# Altium footprint library 6-Connectors-4.PcbLib: 166 footprints (part 1 of 12) (continued)
## 3M_N2534-5002RB [mm] "34 Contacts - Right Angle .100\" x .100\" Low Profile Four-Wall Header"
height 8.59
pads (34):
  round 1.6 hole 1: 1(-20.32,-1.27) 2(-20.32,1.27) 3(-17.78,-1.27) 4(-17.78,1.27) 5(-15.24,-1.27) 6(-15.24,1.27) 7(-12.7,-1.27) 8(-12.7,1.27) 9(-10.16,-1.27) 10(-10.16,1.27) 11(-7.62,-1.27) 12(-7.62,1.27) 13(-5.08,-1.27) 14(-5.08,1.27) 15(-2.54,-1.27) 16(-2.54,1.27) 17(0,-1.27) 18(0,1.27) 19(2.54,-1.27) 20(2.54,1.27) 21(5.08,-1.27) 22(5.08,1.27) 23(7.62,-1.27) 24(7.62,1.27) 25(10.16,-1.27) 26(10.16,1.27) 27(12.7,-1.27) 28(12.7,1.27) 29(15.24,-1.27) 30(15.24,1.27) 31(17.78,-1.27) 32(17.78,1.27) 33(20.32,-1.27) 34(20.32,1.27)
Top Overlay:
  circle w0.3: c-22.09,-1.27 r0.15
  lines w0.2: -21.333,11.28 -20.317,8.74 -19.301,11.28 ; -18.539,2.466 -18.539,11.28 ; -18.539,4.015 -17.269,4.015 -17.269,6.301 cw(c-16.507,6.301) -15.745,6.301 -15.745,4.015 -14.475,4.015 ; -17.548,11.28 -17.548,10.06 -15.465,10.06 -15.465,11.28 ; -17.269,4.853 -15.745,4.853 ; -14.475,2.466 -14.475,11.28 ; -3.362,11.28 cw(c-3.362,10.01) -2.092,10.01 -2.092,4.345 ccw(c-1.457,4.345) -1.457,3.71 ; -2.092,4.853 2.099,4.853 ; -1.457,3.71 1.464,3.71 ; -0.311,4.853 0.318,4.853 0.318,10.619 ; -0.305,4.853 -0.305,10.628 ; 1.464,3.71 ccw(c1.464,4.345) 2.099,4.345 2.099,10.01 ; 2.099,10.01 cw(c3.369,10.01) 3.369,11.28 ; 17.021,2.466 17.021,11.28 ; 17.021,4.015 18.291,4.015 18.291,6.301 cw(c19.053,6.301) 19.815,6.301 19.815,4.015 21.085,4.015 ; 18.012,11.28 18.012,10.06 20.095,10.06 20.095,11.28 ; 18.291,4.853 19.815,4.853 ; 21.085,2.466 21.085,11.28 ; -0.305,10.628 -0.05,10.954 0.063,10.954 0.318,10.619 ; -0.305,10.628 0.318,10.619 ; -25.244,1.882 -25.244,11.28 25.251,11.28 25.251,1.882 23.498,1.882 cw(c23.244,1.882) 22.99,1.882 22.99,2.466 -22.984,2.466 -22.984,1.882 cw(c-23.238,1.882) -23.492,1.882 -25.244,1.882
  text "34" at 21.805,0.206 h1.02
Mechanical 14:
  circle w0.3: c-22.09,-1.27 r0.15
  lines w0.1: -21.333,11.28 -20.317,8.74 -19.301,11.28 ; -18.539,2.466 -18.539,11.28 ; -18.539,4.015 -17.269,4.015 -17.269,6.301 cw(c-16.507,6.301) -15.745,6.301 -15.745,4.015 -14.475,4.015 ; -17.548,11.28 -17.548,10.06 -15.465,10.06 -15.465,11.28 ; -17.269,4.853 -15.745,4.853 ; -14.475,2.466 -14.475,11.28 ; -3.362,11.28 cw(c-3.362,10.01) -2.092,10.01 -2.092,4.345 ccw(c-1.457,4.345) -1.457,3.71 ; -2.092,4.853 2.099,4.853 ; -1.457,3.71 1.464,3.71 ; -0.311,4.853 0.318,4.853 0.318,10.619 ; -0.305,4.853 -0.305,10.628 ; 1.464,3.71 ccw(c1.464,4.345) 2.099,4.345 2.099,10.01 ; 2.099,10.01 cw(c3.369,10.01) 3.369,11.28 ; 17.021,2.466 17.021,11.28 ; 17.021,4.015 18.291,4.015 18.291,6.301 cw(c19.053,6.301) 19.815,6.301 19.815,4.015 21.085,4.015 ; 18.012,11.28 18.012,10.06 20.095,10.06 20.095,11.28 ; 18.291,4.853 19.815,4.853 ; 21.085,2.466 21.085,11.28 ; -0.305,10.628 -0.05,10.954 0.063,10.954 0.318,10.619 ; -0.305,10.628 0.318,10.619 ; -25.244,1.882 -25.244,11.28 25.251,11.28 25.251,1.882 23.498,1.882 cw(c23.244,1.882) 22.99,1.882 22.99,2.466 -22.984,2.466 -22.984,1.882 cw(c-23.238,1.882) -23.492,1.882 -25.244,1.882
  text "34" at 21.805,0.206 h1.02
Mechanical 15:
  lines w0.05: -0.5,0 0.5,0 ; 0,-0.5 0,0.5
3D body "v160-080.stp": height 0.02, standoff -1.65, extent 19.52,0.47 21.12,2.07
3D body "v160-080.stp": height 0.02, standoff -1.65, extent 19.52,-2.07 21.12,-0.47
3D body "v160-080.stp": height 0.02, standoff -1.65, extent 16.98,0.47 18.58,2.07
3D body "v160-080.stp": height 0.02, standoff -1.65, extent 16.98,-2.07 18.58,-0.47
3D body "v160-080.stp": height 0.02, standoff -1.65, extent 14.44,0.47 16.04,2.07
3D body "v160-080.stp": height 0.02, standoff -1.65, extent 14.44,-2.07 16.04,-0.47
3D body "v160-080.stp": height 0.02, standoff -1.65, extent 11.9,0.47 13.5,2.07
3D body "v160-080.stp": height 0.02, standoff -1.65, extent 11.9,-2.07 13.5,-0.47
3D body "v160-080.stp": height 0.02, standoff -1.65, extent 9.36,0.47 10.96,2.07
3D body "v160-080.stp": height 0.02, standoff -1.65, extent 9.36,-2.07 10.96,-0.47
3D body "v160-080.stp": height 0.02, standoff -1.65, extent 6.82,0.47 8.42,2.07
3D body "v160-080.stp": height 0.02, standoff -1.65, extent 6.82,-2.07 8.42,-0.47
3D body "v160-080.stp": height 0.02, standoff -1.65, extent 4.28,0.47 5.88,2.07
3D body "v160-080.stp": height 0.02, standoff -1.65, extent 4.28,-2.07 5.88,-0.47
3D body "v160-080.stp": height 0.02, standoff -1.65, extent 1.74,0.47 3.34,2.07
3D body "v160-080.stp": height 0.02, standoff -1.65, extent 1.74,-2.07 3.34,-0.47
3D body "v160-080.stp": height 0.02, standoff -1.65, extent -0.8,0.47 0.8,2.07
3D body "v160-080.stp": height 0.02, standoff -1.65, extent -0.8,-2.07 0.8,-0.47
3D body "v160-080.stp": height 0.02, standoff -1.65, extent -3.34,0.47 -1.74,2.07
3D body "v160-080.stp": height 0.02, standoff -1.65, extent -3.34,-2.07 -1.74,-0.47
3D body "v160-080.stp": height 0.02, standoff -1.65, extent -5.88,0.47 -4.28,2.07
3D body "v160-080.stp": height 0.02, standoff -1.65, extent -5.88,-2.07 -4.28,-0.47
3D body "v160-080.stp": height 0.02, standoff -1.65, extent -8.42,0.47 -6.82,2.07
3D body "v160-080.stp": height 0.02, standoff -1.65, extent -8.42,-2.07 -6.82,-0.47
3D body "v160-080.stp": height 0.02, standoff -1.65, extent -10.96,0.47 -9.36,2.07
3D body "v160-080.stp": height 0.02, standoff -1.65, extent -10.96,-2.07 -9.36,-0.47
3D body "v160-080.stp": height 0.02, standoff -1.65, extent -13.5,0.47 -11.9,2.07
3D body "v160-080.stp": height 0.02, standoff -1.65, extent -13.5,-2.07 -11.9,-0.47
3D body "v160-080.stp": height 0.02, standoff -1.65, extent -16.04,-2.07 -14.44,-0.47
3D body "v160-080.stp": height 0.02, standoff -1.65, extent -16.04,0.47 -14.44,2.07
3D body "v160-080.stp": height 0.02, standoff -1.65, extent -18.58,-2.07 -16.98,-0.47
3D body "v160-080.stp": height 0.02, standoff -1.65, extent -18.58,0.47 -16.98,2.07
3D body "v160-080.stp": height 0.02, standoff -1.65, extent -21.12,0.47 -19.52,2.07
3D body "v160-080.stp": height 0.02, standoff -1.65, extent -21.12,-2.07 -19.52,-0.47
3D body "3M_N2534-5002RB.stp": height 8.64, standoff -3.98, extent -25.241,-1.587 25.254,11.267

## 3M_N2540-6V0C-RB-WG [mm] "40 Contacts - Straight SMD .100\" x .100\" Low Profile Four-Wall Header"
height 10.16
pads (40):
  rect 1.27x5.08 smd: 1(-24.13,-3.43) 2(-24.13,3.43) 3(-21.59,-3.43) 4(-21.59,3.43) 5(-19.05,-3.43) 6(-19.05,3.43) 7(-16.51,-3.43) 8(-16.51,3.43) 9(-13.97,-3.43) 10(-13.97,3.43) 11(-11.43,-3.43) 12(-11.43,3.43) 13(-8.89,-3.43) 14(-8.89,3.43) 15(-6.35,-3.43) 16(-6.35,3.43) 17(-3.81,-3.43) 18(-3.81,3.43) 19(-1.27,-3.43) 20(-1.27,3.43) 21(1.27,-3.43) 22(1.27,3.43) 23(3.81,-3.43) 24(3.81,3.43) 25(6.35,-3.43) 26(6.35,3.43) 27(8.89,-3.43) 28(8.89,3.43) 29(11.43,-3.43) 30(11.43,3.43) 31(13.97,-3.43) 32(13.97,3.43) 33(16.51,-3.43) 34(16.51,3.43) 35(19.05,-3.43) 36(19.05,3.43) 37(21.59,-3.43) 38(21.59,3.43) 39(24.13,-3.43) 40(24.13,3.43)
Top Overlay:
  circle w0.3: c-26.88,-4.949 r0.15
  lines w0.2: -28.042,-1.599 -25.629,-1.599 -25.629,1.599 -28.042,1.599 ; -27.94,-1.629 -27.94,1.629 ; -27.744,-4.064 -26.88,-3.2 -26.016,-4.064 ; -25.165,-4.064 -29.058,-4.064 -29.058,4.064 -28.397,4.064 cw(c-27.94,4.064) -27.483,4.064 -25.165,4.064 ; -25.165,-3.175 -28.042,-3.175 -28.042,-1.475 -28.448,-1.475 -28.448,1.475 -28.042,1.475 -28.042,3.175 -25.165,3.175 ; 25.165,-4.064 29.058,-4.064 29.058,4.064 28.397,4.064 ccw(c27.94,4.064) 27.483,4.064 25.165,4.064 ; 25.165,-3.175 28.042,-3.175 28.042,-1.524 28.448,-1.524 28.448,1.524 28.042,1.524 28.042,3.175 25.165,3.175 ; 27.94,-1.645 28.042,-1.631 ; 27.94,1.645 28.042,1.631 ; 25.629,-1.664 25.629,1.664 27.94,1.664 27.94,-1.664 25.629,-1.664
  text "40" at 25.453,4.767 h1.02
Mechanical 8:
  drawing of 324 lines, arcs and shapes, not listed
Mechanical 14:
  lines w0.1: -28.042,-1.599 -25.629,-1.599 -25.629,1.599 -28.042,1.599 ; -27.94,-1.629 -27.94,1.629 ; -27.744,-4.064 -26.88,-3.2 -26.016,-4.064 ; -3.365,-4.064 -3.365,-3.175 ; -2.095,-4.064 -2.095,-2.159 2.096,-2.159 2.096,-4.064 ; -2.095,-3.175 -28.042,-3.175 -28.042,-1.475 -28.448,-1.475 -28.448,1.475 -28.042,1.475 -28.042,3.175 18.979,3.175 18.987,3.175 ; -1.46,-4.064 -1.46,-2.159 ; 1.461,-4.064 1.461,-2.159 ; 2.096,-3.175 28.042,-3.175 28.042,-1.524 28.448,-1.524 28.448,1.524 28.042,1.524 28.042,3.175 23.178,3.175 ; 3.366,-4.064 3.366,-3.175 ; 18.987,4.064 18.987,2.159 23.178,2.159 23.178,4.064 ; 19.622,2.159 19.622,4.064 ; 24.448,3.175 24.448,4.064 ; 27.94,-1.645 28.042,-1.631 ; 27.94,1.645 28.042,1.631 ; -29.058,-4.064 -22.352,-4.064 -22.352,-3.81 -18.288,-3.81 -18.288,-4.064 20.828,-4.064 20.828,-3.81 24.892,-3.81 24.892,-4.064 29.058,-4.064 29.058,4.064 28.397,4.064 ccw(c27.94,4.064) 27.483,4.064 14.427,4.064 ccw(c13.97,4.064) 13.513,4.064 0.457,4.064 ccw(c0,4.064) -0.457,4.064 -13.513,4.064 ccw(c-13.97,4.064) -14.427,4.064 -27.483,4.064 ccw(c-27.94,4.064) -28.397,4.064 -29.058,4.064 -29.058,-4.064 ; 25.629,-1.664 25.629,1.664 27.94,1.664 27.94,-1.664 25.629,-1.664
  text "40" at 25.453,4.767 h1.02
Mechanical 15:
  lines w0.05: -29.308,-6.22 -29.308,6.22 29.308,6.22 29.308,-6.22 -29.308,-6.22
3D body "p508-127.stp": height 0.02, standoff 0, extent 23.495,0.889 24.765,5.969
3D body "p508-127.stp": height 0.02, standoff 0, extent 23.495,-5.971 24.765,-0.891
3D body "p508-127.stp": height 0.02, standoff 0, extent 20.955,0.889 22.225,5.969
3D body "p508-127.stp": height 0.02, standoff 0, extent 20.955,-5.971 22.225,-0.891
3D body "p508-127.stp": height 0.02, standoff 0, extent 18.415,0.889 19.685,5.969
3D body "p508-127.stp": height 0.02, standoff 0, extent 18.415,-5.971 19.685,-0.891
3D body "p508-127.stp": height 0.02, standoff 0, extent 15.875,0.889 17.145,5.969
3D body "p508-127.stp": height 0.02, standoff 0, extent 15.875,-5.971 17.145,-0.891
3D body "p508-127.stp": height 0.02, standoff 0, extent 13.335,0.889 14.605,5.969
3D body "p508-127.stp": height 0.02, standoff 0, extent 13.335,-5.971 14.605,-0.891
3D body "p508-127.stp": height 0.02, standoff 0, extent 10.795,0.889 12.065,5.969
3D body "p508-127.stp": height 0.02, standoff 0, extent 10.795,-5.971 12.065,-0.891
3D body "p508-127.stp": height 0.02, standoff 0, extent 8.255,0.889 9.525,5.969
3D body "p508-127.stp": height 0.02, standoff 0, extent 8.255,-5.971 9.525,-0.891
3D body "p508-127.stp": height 0.02, standoff 0, extent 5.715,0.889 6.985,5.969
3D body "p508-127.stp": height 0.02, standoff 0, extent 5.715,-5.971 6.985,-0.891
3D body "p508-127.stp": height 0.02, standoff 0, extent 3.175,0.889 4.445,5.969
3D body "p508-127.stp": height 0.02, standoff 0, extent 3.175,-5.971 4.445,-0.891
3D body "p508-127.stp": height 0.02, standoff 0, extent 0.635,0.889 1.905,5.969
3D body "p508-127.stp": height 0.02, standoff 0, extent 0.635,-5.971 1.905,-0.891
3D body "p508-127.stp": height 0.02, standoff 0, extent -1.905,0.889 -0.635,5.969
3D body "p508-127.stp": height 0.02, standoff 0, extent -1.905,-5.971 -0.635,-0.891
3D body "p508-127.stp": height 0.02, standoff 0, extent -4.445,0.889 -3.175,5.969
3D body "p508-127.stp": height 0.02, standoff 0, extent -4.445,-5.971 -3.175,-0.891
3D body "p508-127.stp": height 0.02, standoff 0, extent -6.985,0.889 -5.715,5.969
3D body "p508-127.stp": height 0.02, standoff 0, extent -6.985,-5.971 -5.715,-0.891
3D body "p508-127.stp": height 0.02, standoff 0, extent -9.525,0.889 -8.255,5.969
3D body "p508-127.stp": height 0.02, standoff 0, extent -9.525,-5.971 -8.255,-0.891
3D body "p508-127.stp": height 0.02, standoff 0, extent -12.065,0.889 -10.795,5.969
3D body "p508-127.stp": height 0.02, standoff 0, extent -12.065,-5.971 -10.795,-0.891
3D body "p508-127.stp": height 0.02, standoff 0, extent -14.605,0.889 -13.335,5.969
3D body "p508-127.stp": height 0.02, standoff 0, extent -14.605,-5.971 -13.335,-0.891
3D body "p508-127.stp": height 0.02, standoff 0, extent -17.145,0.889 -15.875,5.969
3D body "p508-127.stp": height 0.02, standoff 0, extent -17.145,-5.971 -15.875,-0.891
3D body "p508-127.stp": height 0.02, standoff 0, extent -19.685,-5.971 -18.415,-0.891
3D body "p508-127.stp": height 0.02, standoff 0, extent -22.225,-5.971 -20.955,-0.891
3D body "p508-127.stp": height 0.02, standoff 0, extent -24.765,-5.971 -23.495,-0.891
3D body "p508-127.stp": height 0.02, standoff 0, extent -19.685,0.889 -18.415,5.969
3D body "p508-127.stp": height 0.02, standoff 0, extent -22.225,0.889 -20.955,5.969
3D body "p508-127.stp": height 0.02, standoff 0, extent -24.765,0.889 -23.495,5.969
3D body "3M_N2540-6V0C-RB-WG.stp": height 10.16, standoff 0, extent -29.057,-5.588 29.058,5.588

## 3M_N2550-5002RB [mm] "50 Contacts - Right Angle .100\" x .100\" Low Profile Four-Wall Header"
height 8.59
pads (50):
  round 1.6 hole 0.9: 1(-30.48,-1.27) 2(-30.48,1.27) 3(-27.94,-1.27) 4(-27.94,1.27) 5(-25.4,-1.27) 6(-25.4,1.27) 7(-22.86,-1.27) 8(-22.86,1.27) 9(-20.32,-1.27) 10(-20.32,1.27) 11(-17.78,-1.27) 12(-17.78,1.27) 13(-15.24,-1.27) 14(-15.24,1.27) 15(-12.7,-1.27) 16(-12.7,1.27) 17(-10.16,-1.27) 18(-10.16,1.27) 19(-7.62,-1.27) 20(-7.62,1.27) 21(-5.08,-1.27) 22(-5.08,1.27) 23(-2.54,-1.27) 24(-2.54,1.27) 25(0,-1.27) 26(0,1.27) 27(2.54,-1.27) 28(2.54,1.27) 29(5.08,-1.27) 30(5.08,1.27) 31(7.62,-1.27) 32(7.62,1.27) 33(10.16,-1.27) 34(10.16,1.27) 35(12.7,-1.27) 36(12.7,1.27) 37(15.24,-1.27) 38(15.24,1.27) 39(17.78,-1.27) 40(17.78,1.27) 41(20.32,-1.27) 42(20.32,1.27) 43(22.86,-1.27) 44(22.86,1.27) 45(25.4,-1.27) 46(25.4,1.27) 47(27.94,-1.27) 48(27.94,1.27) 49(30.48,-1.27) 50(30.48,1.27)
Top Overlay:
  circle w0.3: c-32.25,-1.27 r0.15
  lines w0.2: -28.702,2.459 -28.702,11.273 ; -28.702,4.009 -27.432,4.009 -27.432,6.295 ; -27.711,11.273 -27.711,10.054 -25.629,10.054 -25.629,11.273 ; -27.432,4.85 -25.908,4.847 ; -27.432,6.297 cw(c-26.67,6.297) -25.908,6.297 ; -25.908,6.295 -25.908,4.009 -24.638,4.007 ; -24.638,2.459 -24.638,11.273 ; -3.366,11.273 cw(c-3.366,10.003) -2.096,10.003 -2.095,4.339 ccw(c-1.46,4.339) -1.46,3.704 1.46,3.704 ccw(c1.46,4.339) 2.095,4.339 2.095,10.003 cw(c3.366,10.003) 3.366,11.273 ; -2.095,4.847 2.095,4.847 ; -0.314,4.853 -0.314,10.719 ; 0.314,4.847 0.314,10.719 ; 27.178,2.459 27.178,11.273 ; 27.178,4.009 28.448,4.009 28.448,6.295 cw(c29.21,6.295) 29.972,6.295 29.972,4.009 31.242,4.009 ; 28.448,4.847 29.972,4.847 ; 31.242,2.459 31.242,11.273 ; -0.314,10.719 -0.06,10.973 0.06,10.973 0.314,10.719 ; -0.314,10.719 0.314,10.719 ; -35.408,1.875 -33.655,1.875 ccw(c-33.401,1.875) -33.147,1.875 -33.147,2.459 33.147,2.459 33.147,1.875 ccw(c33.401,1.875) 33.655,1.875 35.408,1.875 35.408,11.273 -35.408,11.273 -35.408,1.875
  text "50" at 31.965,0.206 h1.02
Mechanical 8:
  drawing of 204 lines, arcs and shapes, not listed
Mechanical 14:
  circle w0.3: c-32.25,-1.27 r0.15
  lines w0.1: -28.702,2.459 -28.702,11.273 ; -28.702,4.009 -27.432,4.009 -27.432,6.295 ; -27.711,11.273 -27.711,10.054 -25.629,10.054 -25.629,11.273 ; -27.432,4.85 -25.908,4.847 ; -27.432,6.297 cw(c-26.67,6.297) -25.908,6.297 ; -25.908,6.295 -25.908,4.009 -24.638,4.007 ; -24.638,2.459 -24.638,11.273 ; -3.366,11.273 cw(c-3.366,10.003) -2.096,10.003 -2.095,4.339 ccw(c-1.46,4.339) -1.46,3.704 1.46,3.704 ccw(c1.46,4.339) 2.095,4.339 2.095,10.003 cw(c3.366,10.003) 3.366,11.273 ; -2.095,4.847 2.095,4.847 ; -0.314,4.853 -0.314,10.719 ; 0.314,4.847 0.314,10.719 ; 27.178,2.459 27.178,11.273 ; 27.178,4.009 28.448,4.009 28.448,6.295 cw(c29.21,6.295) 29.972,6.295 29.972,4.009 31.242,4.009 ; 28.448,4.847 29.972,4.847 ; 31.242,2.459 31.242,11.273 ; -0.314,10.719 -0.06,10.973 0.06,10.973 0.314,10.719 ; -0.314,10.719 0.314,10.719 ; -35.408,1.875 -33.655,1.875 ccw(c-33.401,1.875) -33.147,1.875 -33.147,2.459 33.147,2.459 33.147,1.875 ccw(c33.401,1.875) 33.655,1.875 35.408,1.875 35.408,11.273 -35.408,11.273 -35.408,1.875
  text "50" at 31.965,0.206 h1.02
3D body "v160-080.stp": height 0.02, standoff -1.65, extent 29.68,0.47 31.28,2.07
3D body "v160-080.stp": height 0.02, standoff -1.65, extent 29.68,-2.07 31.28,-0.47
3D body "v160-080.stp": height 0.02, standoff -1.65, extent 27.14,0.47 28.74,2.07
3D body "v160-080.stp": height 0.02, standoff -1.65, extent 27.14,-2.07 28.74,-0.47
3D body "v160-080.stp": height 0.02, standoff -1.65, extent 24.6,0.47 26.2,2.07
3D body "v160-080.stp": height 0.02, standoff -1.65, extent 24.6,-2.07 26.2,-0.47
3D body "v160-080.stp": height 0.02, standoff -1.65, extent 22.06,0.47 23.66,2.07
3D body "v160-080.stp": height 0.02, standoff -1.65, extent 22.06,-2.07 23.66,-0.47
3D body "v160-080.stp": height 0.02, standoff -1.65, extent 19.52,0.47 21.12,2.07
3D body "v160-080.stp": height 0.02, standoff -1.65, extent 19.52,-2.07 21.12,-0.47
3D body "v160-080.stp": height 0.02, standoff -1.65, extent 16.98,0.47 18.58,2.07
3D body "v160-080.stp": height 0.02, standoff -1.65, extent 16.98,-2.07 18.58,-0.47
3D body "v160-080.stp": height 0.02, standoff -1.65, extent 14.44,0.47 16.04,2.07
3D body "v160-080.stp": height 0.02, standoff -1.65, extent 14.44,-2.07 16.04,-0.47
3D body "v160-080.stp": height 0.02, standoff -1.65, extent 11.9,0.47 13.5,2.07
3D body "v160-080.stp": height 0.02, standoff -1.65, extent 11.9,-2.07 13.5,-0.47
3D body "v160-080.stp": height 0.02, standoff -1.65, extent 9.36,0.47 10.96,2.07
3D body "v160-080.stp": height 0.02, standoff -1.65, extent 9.36,-2.07 10.96,-0.47
3D body "v160-080.stp": height 0.02, standoff -1.65, extent 6.82,0.47 8.42,2.07
3D body "v160-080.stp": height 0.02, standoff -1.65, extent 6.82,-2.07 8.42,-0.47
3D body "v160-080.stp": height 0.02, standoff -1.65, extent 4.28,0.47 5.88,2.07
3D body "v160-080.stp": height 0.02, standoff -1.65, extent 4.28,-2.07 5.88,-0.47
3D body "v160-080.stp": height 0.02, standoff -1.65, extent 1.74,0.47 3.34,2.07
3D body "v160-080.stp": height 0.02, standoff -1.65, extent 1.74,-2.07 3.34,-0.47
3D body "v160-080.stp": height 0.02, standoff -1.65, extent -0.8,0.47 0.8,2.07
3D body "v160-080.stp": height 0.02, standoff -1.65, extent -0.8,-2.07 0.8,-0.47
3D body "v160-080.stp": height 0.02, standoff -1.65, extent -3.34,0.47 -1.74,2.07
3D body "v160-080.stp": height 0.02, standoff -1.65, extent -3.34,-2.07 -1.74,-0.47
3D body "v160-080.stp": height 0.02, standoff -1.65, extent -5.88,0.47 -4.28,2.07
3D body "v160-080.stp": height 0.02, standoff -1.65, extent -5.88,-2.07 -4.28,-0.47
3D body "v160-080.stp": height 0.02, standoff -1.65, extent -8.42,0.47 -6.82,2.07
3D body "v160-080.stp": height 0.02, standoff -1.65, extent -8.42,-2.07 -6.82,-0.47
3D body "v160-080.stp": height 0.02, standoff -1.65, extent -10.96,0.47 -9.36,2.07
3D body "v160-080.stp": height 0.02, standoff -1.65, extent -10.96,-2.07 -9.36,-0.47
3D body "v160-080.stp": height 0.02, standoff -1.65, extent -13.5,0.47 -11.9,2.07
3D body "v160-080.stp": height 0.02, standoff -1.65, extent -13.5,-2.07 -11.9,-0.47
3D body "v160-080.stp": height 0.02, standoff -1.65, extent -16.04,0.47 -14.44,2.07
3D body "v160-080.stp": height 0.02, standoff -1.65, extent -16.04,-2.07 -14.44,-0.47
3D body "v160-080.stp": height 0.02, standoff -1.65, extent -18.58,0.47 -16.98,2.07
3D body "v160-080.stp": height 0.02, standoff -1.65, extent -18.58,-2.07 -16.98,-0.47
3D body "v160-080.stp": height 0.02, standoff -1.65, extent -21.12,0.47 -19.52,2.07
3D body "v160-080.stp": height 0.02, standoff -1.65, extent -21.12,-2.07 -19.52,-0.47
3D body "v160-080.stp": height 0.02, standoff -1.65, extent -23.66,0.47 -22.06,2.07
3D body "v160-080.stp": height 0.02, standoff -1.65, extent -23.66,-2.07 -22.06,-0.47
3D body "v160-080.stp": height 0.02, standoff -1.65, extent -26.2,0.47 -24.6,2.07
3D body "v160-080.stp": height 0.02, standoff -1.65, extent -26.2,-2.07 -24.6,-0.47
3D body "v160-080.stp": height 0.02, standoff -1.65, extent -28.74,-2.07 -27.14,-0.47
3D body "v160-080.stp": height 0.02, standoff -1.65, extent -28.74,0.47 -27.14,2.07
3D body "v160-080.stp": height 0.02, standoff -1.65, extent -31.28,0.47 -29.68,2.07
3D body "v160-080.stp": height 0.02, standoff -1.65, extent -31.28,-2.07 -29.68,-0.47
3D body "3M_N2550-5002RB.stp": height 8.69, standoff -3.98, extent -35.408,-1.575 35.408,11.273

## CE [mm]
Top Overlay:
  lines w0.6: 0,-2.413 cw(c0,0) 0,2.413 ; 2.53,0 4.6,0 ; 4.826,-2.438 cw(c4.826,-0.025) 4.826,2.388
3D body "ce.stp": height 0.02, standoff 0, extent -2.725,-2.725 4.82,2.725

## COMATEL_385.0211.1.08.400 [mm] "Wire-Wrap contact (Pin Length= 16.5mm)"
height 18.2
pads (8):
  round 1.6 hole 0.9: 1(0,0) 2(2.54,0) 3(5.08,0) 4(7.62,0) 5(10.16,0) 6(12.7,0) 7(15.24,0) 8(17.78,0)
Top Overlay:
  circle w0.3: c-0.508,1.778 r0.15
  lines w0.2: 1.27,-1.025 1.07,-1.225 -1.07,-1.225 -1.27,-1.025 -1.27,1.025 -1.07,1.225 1.07,1.225 1.27,1.025 ; 1.27,-1.025 1.27,1.025 ; 1.27,-1.025 1.47,-1.225 3.61,-1.225 3.81,-1.025 ; 1.27,-1.025 1.27,1.025 ; 1.27,1.025 1.47,1.225 3.61,1.225 3.81,1.025 ; 3.81,-1.025 3.81,1.025 ; 3.81,-1.025 4.01,-1.225 6.15,-1.225 6.35,-1.025 ; 3.81,-1.025 3.81,1.025 ; 3.81,1.025 4.01,1.225 6.15,1.225 6.35,1.025 ; 6.35,-1.025 6.35,1.025 ; 6.35,-1.025 6.55,-1.225 8.69,-1.225 8.89,-1.025 ; 6.35,-1.025 6.35,1.025 ; 6.35,1.025 6.55,1.225 8.69,1.225 8.89,1.025 ; 8.89,-1.025 8.89,1.025 ; 8.89,-1.025 9.09,-1.225 11.23,-1.225 11.43,-1.025 ; 8.89,-1.025 8.89,1.025 ; 8.89,1.025 9.09,1.225 11.23,1.225 11.43,1.025 ; 11.43,-1.025 11.43,1.025 ; 11.43,-1.025 11.63,-1.225 13.77,-1.225 13.97,-1.025 ; 11.43,-1.025 11.43,1.025 ; 11.43,1.025 11.63,1.225 13.77,1.225 13.97,1.025 ; 13.97,-1.025 13.97,1.025 ; 13.97,-1.025 14.17,-1.225 16.31,-1.225 16.51,-1.025 ; 13.97,-1.025 13.97,1.025 ; 13.97,1.025 14.17,1.225 16.31,1.225 16.51,1.025 ; 16.51,-1.025 16.51,1.025 ; 16.51,-1.025 16.71,-1.225 18.85,-1.225 19.05,-1.025 19.05,1.025 18.85,1.225 16.71,1.225 16.51,1.025 ; 16.51,-1.025 16.51,1.025
Mechanical 8:
  lines w0.1: -1,0 0,0 ; 0,-1 0,0 ; 0,1 0,0 ; 1,0 0,0 ; 1.54,0 2.54,0 ; 2.54,-1 2.54,0 ; 2.54,1 2.54,0 ; 3.54,0 2.54,0 ; 4.08,0 5.08,0 ; 5.08,-1 5.08,0 ; 5.08,1 5.08,0 ; 6.08,0 5.08,0 ; 6.62,0 7.62,0 ; 7.62,-1 7.62,0 ; 7.62,1 7.62,0 ; 8.62,0 7.62,0 ; 9.16,0 10.16,0 ; 10.16,-1 10.16,0 ; 10.16,1 10.16,0 ; 11.16,0 10.16,0 ; 11.7,0 12.7,0 ; 12.7,-1 12.7,0 ; 12.7,1 12.7,0 ; 13.7,0 12.7,0 ; 14.24,0 15.24,0 ; 15.24,-1 15.24,0 ; 15.24,1 15.24,0 ; 16.24,0 15.24,0 ; 16.78,0 17.78,0 ; 17.78,-1 17.78,0 ; 17.78,1 17.78,0 ; 18.78,0 17.78,0
Mechanical 14:
  circle w0.3: c-0.508,1.778 r0.15
  lines w0.1: 1.27,-1.025 1.27,1.025 ; 1.27,-1.025 1.07,-1.225 -1.07,-1.225 -1.27,-1.025 -1.27,1.025 -1.07,1.225 1.07,1.225 1.27,1.025 ; 1.27,-1.025 1.27,1.025 ; 1.27,-1.025 1.47,-1.225 3.61,-1.225 3.81,-1.025 ; 1.27,1.025 1.47,1.225 3.61,1.225 3.81,1.025 ; 3.81,-1.025 3.81,1.025 ; 3.81,-1.025 3.81,1.025 ; 3.81,-1.025 4.01,-1.225 6.15,-1.225 6.35,-1.025 ; 3.81,1.025 4.01,1.225 6.15,1.225 6.35,1.025 ; 6.35,-1.025 6.35,1.025 ; 6.35,-1.025 6.35,1.025 ; 6.35,-1.025 6.55,-1.225 8.69,-1.225 8.89,-1.025 ; 6.35,1.025 6.55,1.225 8.69,1.225 8.89,1.025 ; 8.89,-1.025 8.89,1.025 ; 8.89,-1.025 8.89,1.025 ; 8.89,-1.025 9.09,-1.225 11.23,-1.225 11.43,-1.025 ; 8.89,1.025 9.09,1.225 11.23,1.225 11.43,1.025 ; 11.43,-1.025 11.43,1.025 ; 11.43,-1.025 11.43,1.025 ; 11.43,-1.025 11.63,-1.225 13.77,-1.225 13.97,-1.025 ; 11.43,1.025 11.63,1.225 13.77,1.225 13.97,1.025 ; 13.97,-1.025 13.97,1.025 ; 13.97,-1.025 13.97,1.025 ; 13.97,-1.025 14.17,-1.225 16.31,-1.225 16.51,-1.025 ; 13.97,1.025 14.17,1.225 16.31,1.225 16.51,1.025 ; 16.51,-1.025 16.51,1.025 ; 16.51,-1.025 16.51,1.025 ; 16.51,-1.025 16.71,-1.225 18.85,-1.225 19.05,-1.025 19.05,1.025 18.85,1.225 16.71,1.225 16.51,1.025
3D body "COMATEL_385.0211.1.08.400.stp": height 18.2, standoff -3.8, extent -1.27,-1.225 19.05,1.225

## COMATEL_385.0334.1.20.400 [mm] "Wire-Wrap contact (Pin Length= 7.5mm)"
height 9.2
pads (20):
  round 1.6 hole 0.9: 1(0,0) 2(2.54,0) 3(5.08,0) 4(7.62,0) 5(10.16,0) 6(12.7,0) 7(15.24,0) 8(17.78,0) 9(20.32,0) 10(22.86,0) 11(25.4,0) 12(27.94,0) 13(30.48,0) 14(33.02,0) 15(35.56,0) 16(38.1,0) 17(40.64,0) 18(43.18,0) 19(45.72,0) 20(48.26,0)
Top Overlay:
  drawing of 161 lines, arcs and shapes, not listed
Mechanical 14:
  drawing of 161 lines, arcs and shapes, not listed
3D body "COMATEL_385.0334.1.20.400.stp": height 9.2, standoff -3.3, extent -1.27,-1.225 49.53,1.225

## COMATEL_385.0358.1.02.400 [mm] "2 Contacts Straight Strip Header Pitch 2.54mm L=6.3mm ''Mini-Wire-Wrap''"
height 8
pads (2):
  round 1.6 hole 0.9: 1(0,0) 2(2.54,0)
Top Overlay:
  circle w0.3: c-0.508,1.778 r0.15
  lines w0.2: 1.27,-1.025 1.47,-1.225 3.61,-1.225 3.81,-1.025 3.81,1.025 3.61,1.225 1.47,1.225 1.27,1.025 ; 1.27,-1.025 1.27,1.025 ; 1.27,-1.025 1.07,-1.225 -1.07,-1.225 -1.27,-1.025 -1.27,1.025 -1.07,1.225 1.07,1.225 1.27,1.025
Mechanical 14:
  circle w0.3: c-0.508,1.778 r0.15
  lines w0.1: 1.27,-1.025 1.47,-1.225 3.61,-1.225 3.81,-1.025 3.81,1.025 3.61,1.225 1.47,1.225 1.27,1.025 ; 1.27,-1.025 1.27,1.025 ; 1.27,-1.025 1.07,-1.225 -1.07,-1.225 -1.27,-1.025 -1.27,1.025 -1.07,1.225 1.07,1.225 1.27,1.025
3D body "COMATEL_385.0358.1.02.400.stp": height 8, standoff -3.2, extent -1.27,-1.225 3.81,1.225

## COMATEL_385.0358.1.03.400 [mm] "3 Contacts Straight Strip Header Pitch 2.54mm L=6.3mm ''Mini-Wire-Wrap''"
height 8
pads (3):
  round 1.6 hole 0.9: 1(0,0) 2(2.54,0) 3(5.08,0)
Top Overlay:
  circle w0.3: c-0.508,1.778 r0.15
  lines w0.2: -1.27,1.025 -1.07,1.225 ; -1.27,1.025 -1.27,-1.025 -1.07,-1.225 1.07,-1.225 1.27,-1.025 ; -1.27,1.025 -1.07,1.225 ; -1.07,1.225 1.07,1.225 1.27,1.025 ; 1.27,-1.025 1.47,-1.225 3.61,-1.225 3.81,-1.025 ; 1.27,-1.025 1.27,1.025 ; 1.27,1.025 1.47,1.225 3.61,1.225 3.81,1.025 ; 3.81,-1.025 4.01,-1.225 6.15,-1.225 6.35,-1.025 6.35,1.025 6.15,1.225 4.01,1.225 3.81,1.025 ; 3.81,-1.025 3.81,1.025
Mechanical 14:
  circle w0.3: c-0.508,1.778 r0.15
  lines w0.1: 1.27,-1.025 1.47,-1.225 3.61,-1.225 3.81,-1.025 ; 1.27,-1.025 1.27,1.025 ; 1.27,-1.025 1.07,-1.225 -1.07,-1.225 -1.27,-1.025 -1.27,1.025 -1.07,1.225 1.07,1.225 1.27,1.025 ; 1.27,1.025 1.47,1.225 3.61,1.225 3.81,1.025 ; 3.81,-1.025 4.01,-1.225 6.15,-1.225 6.35,-1.025 6.35,1.025 6.15,1.225 4.01,1.225 3.81,1.025 ; 3.81,-1.025 3.81,1.025
3D body "COMATEL_385.0358.1.03.400.stp": height 8, standoff -3.2, extent -1.27,-1.225 6.35,1.225

## COMATEL_385.0358.1.04.400 [mm] "4 Contacts Straight Strip Header Pitch 2.54mm L=6.3mm ''Mini-Wire-Wrap''"
height 8
pads (4):
  oct 1.6x1.6 hole 0.9: 1(0,0)
  round 1.6 hole 0.9: 2(2.54,0) 3(5.08,0) 4(7.62,0)
Top Overlay:
  circle w0.3: c-0.508,1.778 r0.15
  lines w0.2: 1.27,-1.025 1.47,-1.225 3.61,-1.225 3.81,-1.025 ; 1.27,-1.025 1.27,1.025 ; 1.27,-1.025 1.07,-1.225 -1.07,-1.225 -1.27,-1.025 -1.27,1.025 -1.07,1.225 1.07,1.225 1.27,1.025 ; 1.27,1.025 1.47,1.225 3.61,1.225 3.81,1.025 ; 3.81,-1.025 4.01,-1.225 6.15,-1.225 6.35,-1.025 ; 3.81,-1.025 3.81,1.025 ; 3.81,1.025 4.01,1.225 6.15,1.225 6.35,1.025 ; 6.35,-1.025 6.35,1.025 ; 6.35,-1.025 6.55,-1.225 8.69,-1.225 8.89,-1.025 8.89,1.025 8.69,1.225 6.55,1.225 6.35,1.025
Mechanical 14:
  circle w0.3: c-0.508,1.778 r0.15
  lines w0.1: 1.27,-1.025 1.47,-1.225 3.61,-1.225 3.81,-1.025 ; 1.27,-1.025 1.27,1.025 ; 1.27,-1.025 1.07,-1.225 -1.07,-1.225 -1.27,-1.025 -1.27,1.025 -1.07,1.225 1.07,1.225 1.27,1.025 ; 1.27,1.025 1.47,1.225 3.61,1.225 3.81,1.025 ; 3.81,-1.025 4.01,-1.225 6.15,-1.225 6.35,-1.025 ; 3.81,-1.025 3.81,1.025 ; 3.81,1.025 4.01,1.225 6.15,1.225 6.35,1.025 ; 6.35,-1.025 6.35,1.025 ; 6.35,-1.025 6.35,1.025 ; 6.35,-1.025 6.55,-1.225 8.69,-1.225 8.89,-1.025 8.89,1.025 8.69,1.225 6.55,1.225 6.35,1.025
3D body "m20-254via.stp": height 0.1, standoff -1.82, extent 6.77,-0.85 8.47,0.85
3D body "m20-254via.stp": height 0.1, standoff -1.82, extent 4.23,-0.85 5.93,0.85
3D body "m20-254via.stp": height 0.1, standoff -1.82, extent 1.69,-0.85 3.39,0.85
3D body "m20-254via.stp": height 0.1, standoff -1.82, extent -0.85,-0.85 0.85,0.85
3D body "COMATEL_385.0358.1.04.400.stp": height 8, standoff -3.2, extent -1.27,-1.225 8.89,1.225